# Altium schematic symbol library altera.SCHLIB: 68 symbols (part 6 of 6)
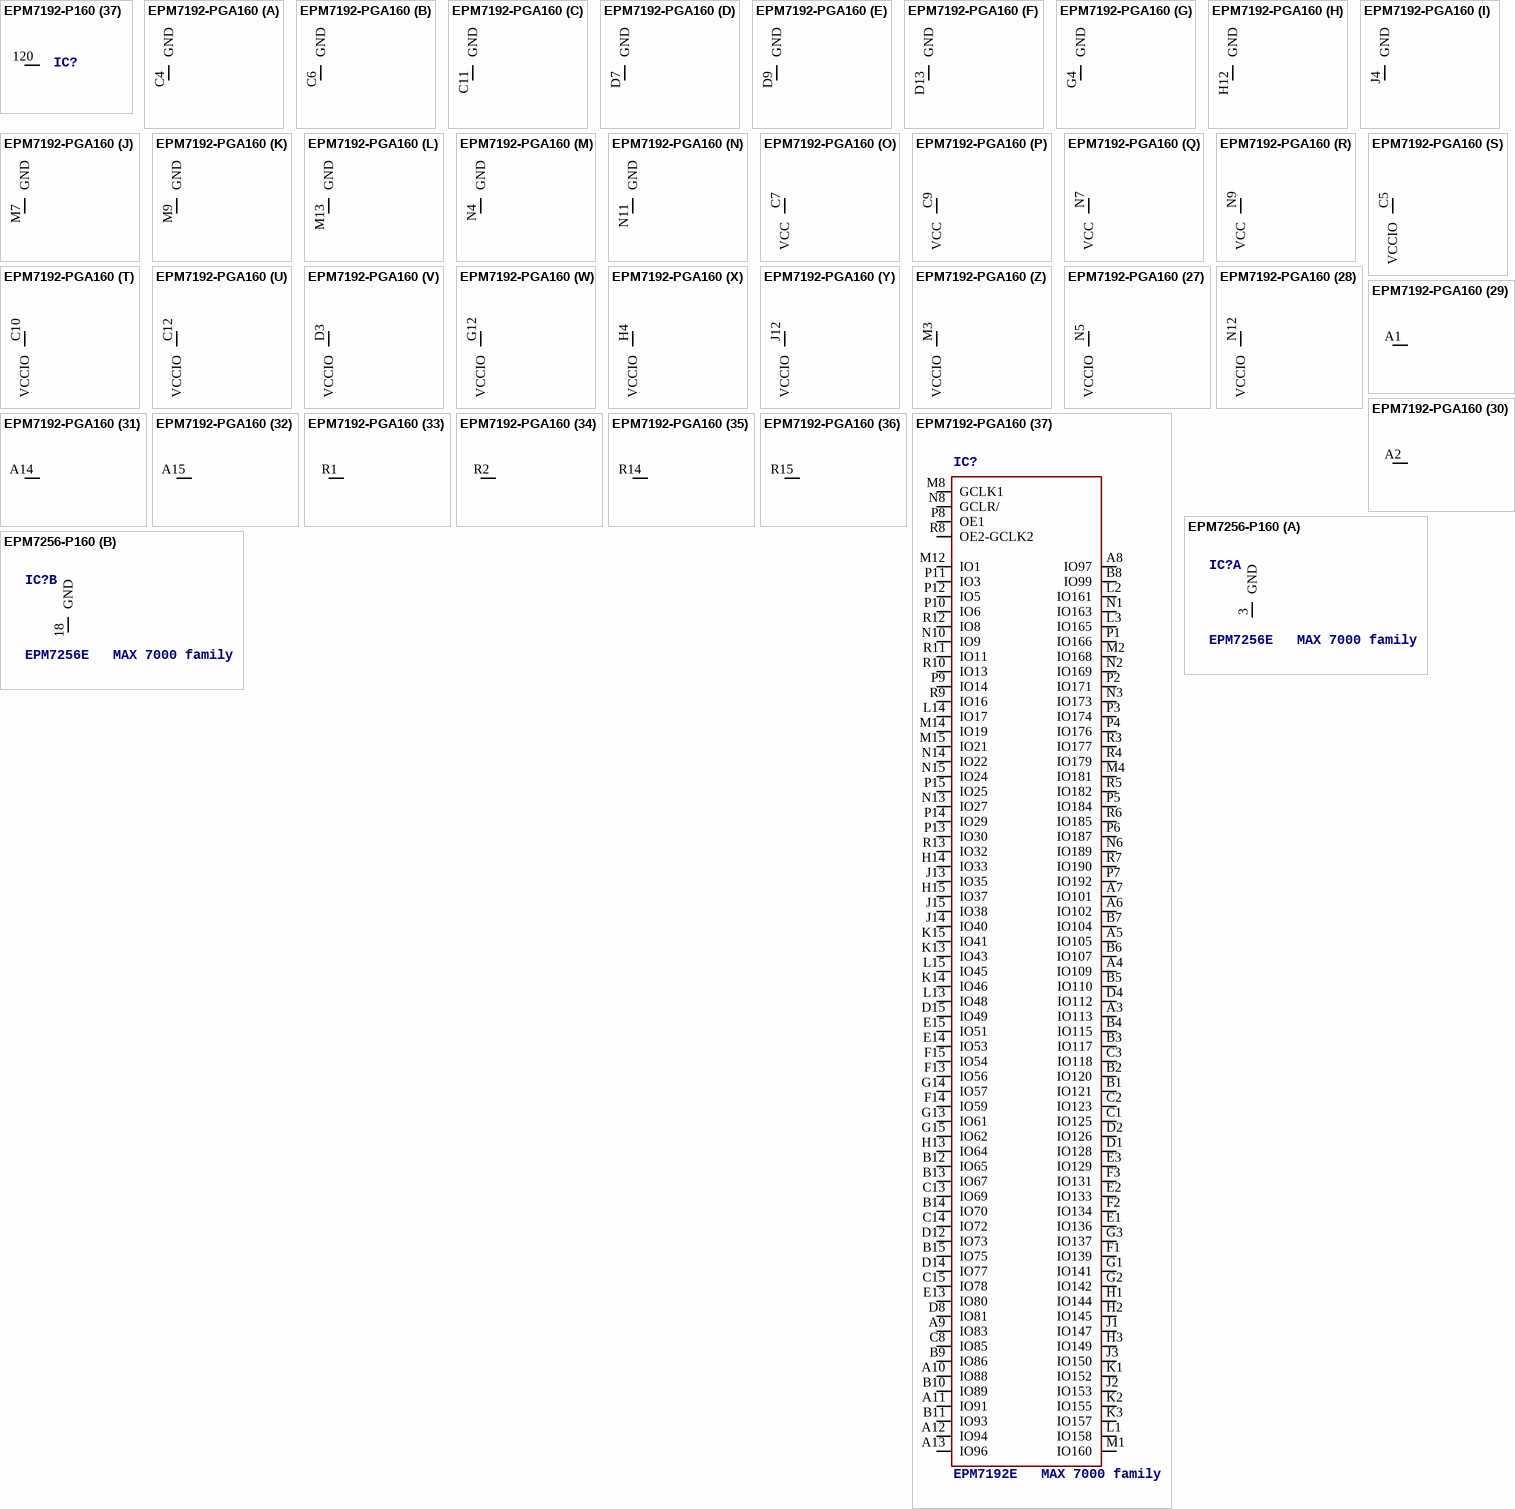
[diagram p62: symbols EPM7192-P160 to EPM7256-P160]

## EPM7192-P160
designator IC?, comment EPM7192E   MAX 7000 family
MPN: EPM7192SQC160-10N; OC_FARNELL: 1549438; OC_NEWARK: 51R9820
footprint PQFP160
part A pins: 3 GND (power)
part B pins: 18 GND (power)
part C pins: 32 GND (power)
part D pins: 47 GND (power)
part E pins: 57 GND (power)
part F pins: 64 GND (power)
part G pins: 66 GND (power)
part H pins: 81 GND (power)
part I pins: 96 GND (power)
part J pins: 111 GND (power)
part K pins: 126 GND (power)
part L pins: 138 GND (power)
part M pins: 143 GND (power)
part N pins: 148 GND (power)
part O pins: 56 VCC (power)
part P pins: 65 VCC (power)
part Q pins: 137 VCC (power)
part R pins: 144 VCC (power)
part S pins: 10 VCCIO (power)
part T pins: 25 VCCIO (power)
part U pins: 40 VCCIO (power)
part V pins: 55 VCCIO (power)
part W pins: 74 VCCIO (power)
part X pins: 89 VCCIO (power)
part Y pins: 103 VCCIO (power)
part Z pins: 118 VCCIO (power)
part 27 pins: 133 VCCIO (power)
part 28 pins: 155 VCCIO (power)
part 29 pins: 2 IO25, 4 IO24, 5 IO22, 6 IO21, 7 IO19, 8 IO17, 9 IO48, 12 IO46, 13 IO45, 14 IO43, 15 IO41, 16 IO40, 17 IO38, 19 IO37, 20 IO35, 21 IO33, 22 IO64, 23 IO62, 24 IO61, 26 IO59, 27 IO57, 28 IO56, 29 IO54, 30 IO53, 31 IO51, 33 IO49, 34 IO80, 35 IO78, 36 IO77, 37 IO75, 38 IO73, 41 IO72, 42 IO70, 43 IO69, 44 IO67, 45 IO65, 46 IO96, 48 IO94, 49 IO93, 50 IO91, 51 IO89, 52 IO88, 53 IO86, 58 IO85, 59 IO83, 60 IO81, 61 IO97, 62 IO99, 63 IO101, 68 IO102, 69 IO104, 70 IO105, 71 IO107, 72 IO109, 73 IO110, 75 IO112, 76 IO113, 77 IO115, 78 IO117, 79 IO118, 80 IO120, 83 IO121, 84 IO123, 85 IO125, 86 IO126, 87 IO128, 88 IO129, 90 IO131, 91 IO133, 92 IO134, 93 IO136, 94 IO137, 95 IO139, 97 IO141, 98 IO142, 99 IO144, 100 IO145, 101 IO147, 102 IO149, 104 IO150, 105 IO152, 106 IO153, 107 IO155, 108 IO157, 109 IO158, 112 IO160, 113 IO161, 114 IO163, 115 IO165, 116 IO166, 117 IO168, 119 IO169, 121 IO171, 122 IO173, 123 IO174, 124 IO176, 125 IO177, 127 IO179, 128 IO181, 129 IO182, 130 IO184, 131 IO185, 132 IO187, 134 IO189, 135 IO190, 136 IO192, 139 GCLK1, 140 OE1, 141 GCLR/, 142 OE2-GCLK2, 145 IO16, 146 IO14, 147 IO13, 149 IO11, 150 IO9, 151 IO8, 152 IO6, 153 IO5, 154 IO3, 156 IO1, 157 IO32, 158 IO30, 159 IO29, 160 IO27
part 30 pins: 1 NC
part 31 pins: 11 NC
part 32 pins: 39 NC
part 33 pins: 54 NC
part 34 pins: 67 NC
part 35 pins: 82 NC
part 36 pins: 110 NC
part 37 pins: 120 NC

## EPM7192-PGA160
designator IC?, comment EPM7192E   MAX 7000 family
OC_FARNELL: unknown; OC_NEWARK: unknown
footprint PGA160
part A pins: C4 GND (power)
part B pins: C6 GND (power)
part C pins: C11 GND (power)
part D pins: D7 GND (power)
part E pins: D9 GND (power)
part F pins: D13 GND (power)
part G pins: G4 GND (power)
part H pins: H12 GND (power)
part I pins: J4 GND (power)
part J pins: M7 GND (power)
part K pins: M9 GND (power)
part L pins: M13 GND (power)
part M pins: N4 GND (power)
part N pins: N11 GND (power)
part O pins: C7 VCC (power)
part P pins: C9 VCC (power)
part Q pins: N7 VCC (power)
part R pins: N9 VCC (power)
part S pins: C5 VCCIO (power)
part T pins: C10 VCCIO (power)
part U pins: C12 VCCIO (power)
part V pins: D3 VCCIO (power)
part W pins: G12 VCCIO (power)
part X pins: H4 VCCIO (power)
part Y pins: J12 VCCIO (power)
part Z pins: M3 VCCIO (power)
part 27 pins: N5 VCCIO (power)
part 28 pins: N12 VCCIO (power)
part 29 pins: A1 NC
part 30 pins: A2 NC
part 31 pins: A14 NC
part 32 pins: A15 NC
part 33 pins: R1 NC
part 34 pins: R2 NC
part 35 pins: R14 NC
part 36 pins: R15 NC
part 37 pins: A3 IO113, A4 IO109, A5 IO105, A6 IO102, A7 IO101, A8 IO97, A9 IO83, A10 IO88, A11 IO91, A12 IO94, A13 IO96, B1 IO121, B2 IO120, B3 IO117, B4 IO115, B5 IO110, B6 IO107, B7 IO104, B8 IO99, B9 IO86, B10 IO89, B11 IO93, B12 IO65, B13 IO67, B14 IO70, B15 IO75, C1 IO125, C2 IO123, C3 IO118, C8 IO85, C13 IO69, C14 IO72, C15 IO78, D1 IO128, D2 IO126, D4 IO112, D8 IO81, D12 IO73, D14 IO77, D15 IO49, E1 IO136, E2 IO133, E3 IO129, E13 IO80, E14 IO53, E15 IO51, F1 IO139, F2 IO134, F3 IO131, F13 IO56, F14 IO59, F15 IO54, G1 IO141, G2 IO142, G3 IO137, G13 IO61, G14 IO57, G15 IO62, H1 IO144, H2 IO145, H3 IO149, H13 IO64, H14 IO33, H15 IO37, J1 IO147, J2 IO153, J3 IO150, J13 IO35, J14 IO40, J15 IO38, K1 IO152, K2 IO155, K3 IO157, K13 IO43, K14 IO46, K15 IO41, L1 IO158, L2 IO161, L3 IO165, L13 IO48, L14 IO17, L15 IO45, M1 IO160, M2 IO168, M4 IO181, M8 GCLK1, M12 IO1, M14 IO19, M15 IO21, N1 IO163, N2 IO169, N3 IO173, N6 IO189, N8 GCLR/, N10 IO9, N13 IO27, N14 IO22, N15 IO24, P1 IO166, P2 IO171, P3 IO174, P4 IO176, P5 IO184, P6 IO187, P7 IO192, P8 OE1, P9 IO14, P10 IO6, P11 IO3, P12 IO5, P13 IO30, P14 IO29, P15 IO25, R3 IO177, R4 IO179, R5 IO182, R6 IO185, R7 IO190, R8 OE2-GCLK2, R9 IO16, R10 IO13, R11 IO11, R12 IO8, R13 IO32

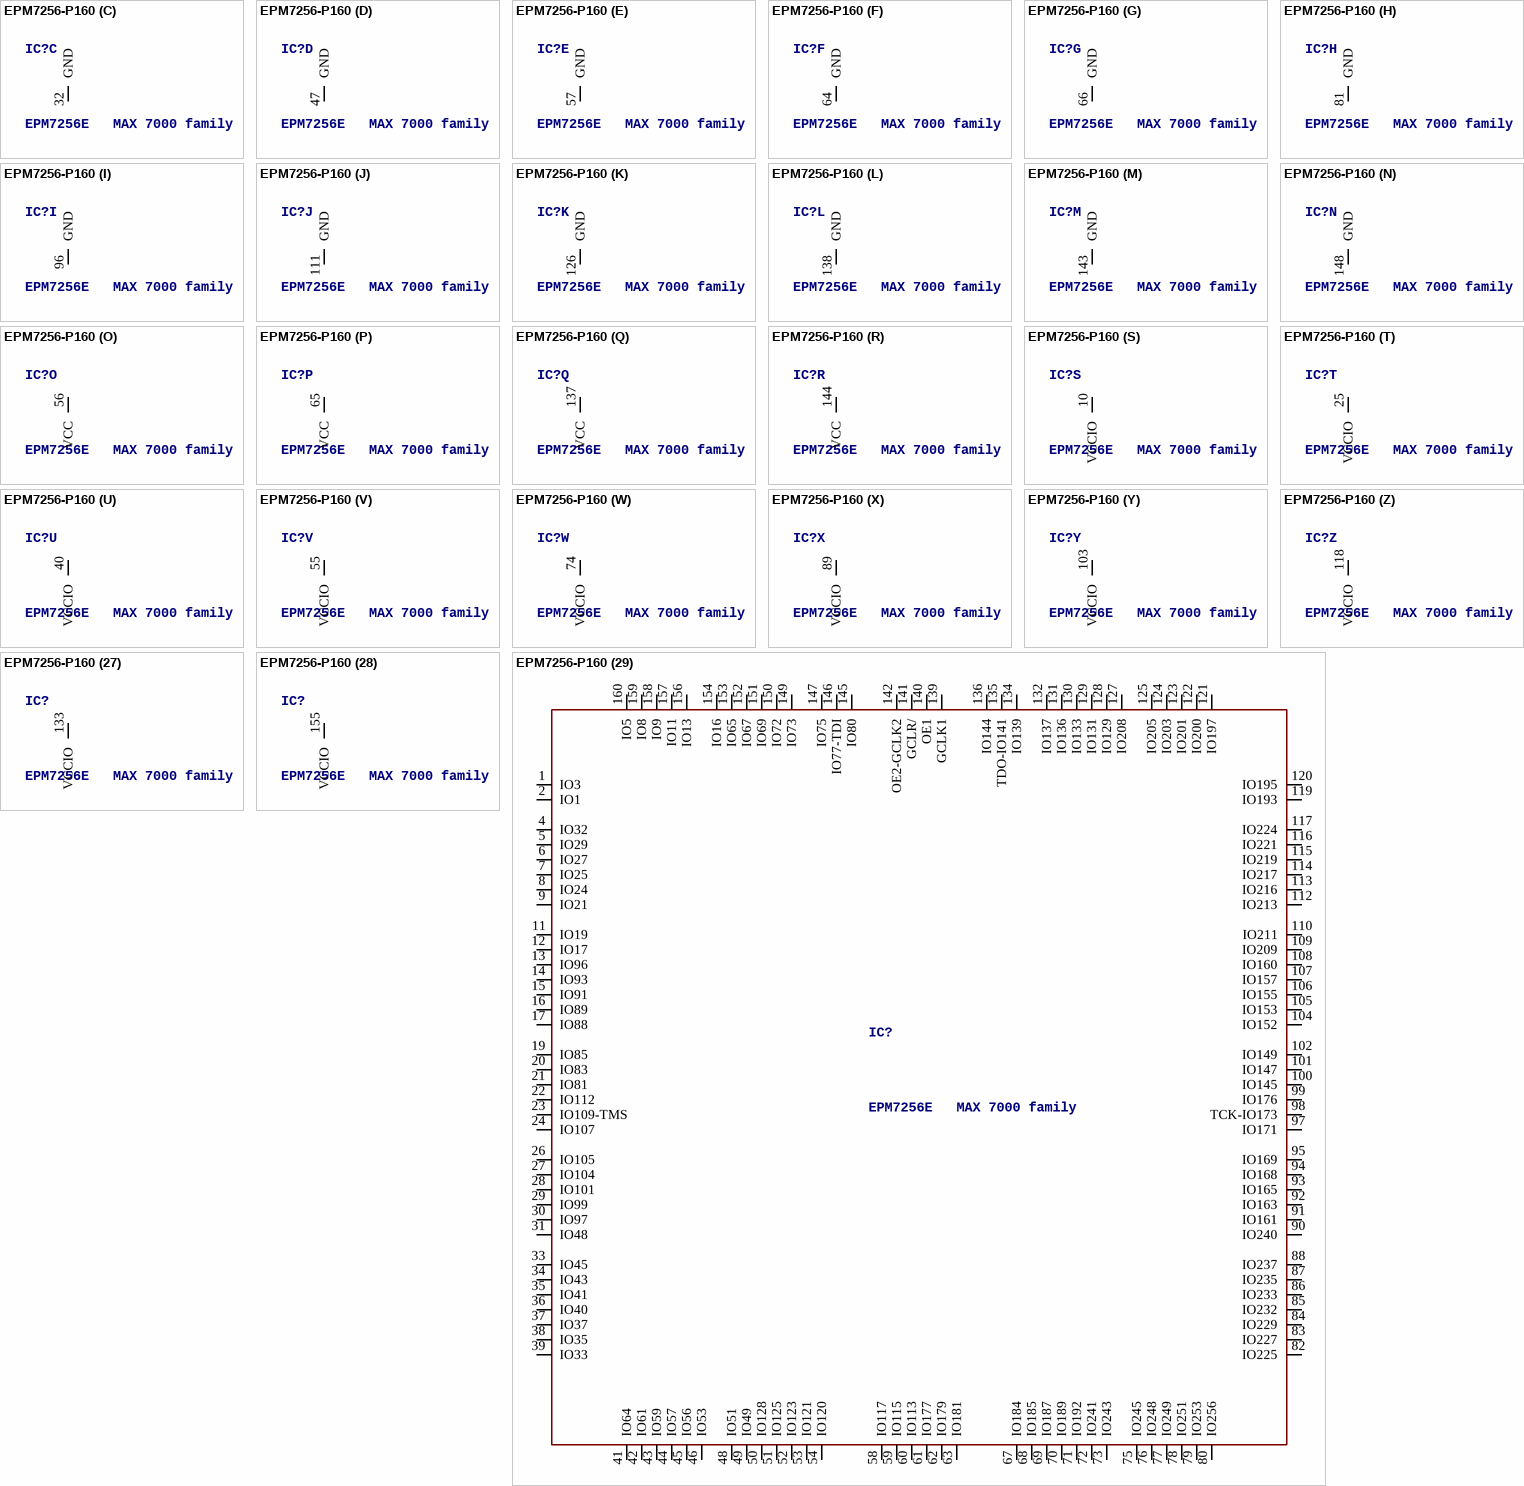
[diagram p48: symbol EPM7256-P160]

## EPM7256-P160
designator IC?, comment EPM7256E   MAX 7000 family
MPN: EPM7256EQC160-12; OC_FARNELL: unknown; OC_NEWARK: 51R9894
footprint PQFP160
part A pins: 3 GND (power)
part B pins: 18 GND (power)
part C pins: 32 GND (power)
part D pins: 47 GND (power)
part E pins: 57 GND (power)
part F pins: 64 GND (power)
part G pins: 66 GND (power)
part H pins: 81 GND (power)
part I pins: 96 GND (power)
part J pins: 111 GND (power)
part K pins: 126 GND (power)
part L pins: 138 GND (power)
part M pins: 143 GND (power)
part N pins: 148 GND (power)
part O pins: 56 VCC (power)
part P pins: 65 VCC (power)
part Q pins: 137 VCC (power)
part R pins: 144 VCC (power)
part S pins: 10 VCCIO (power)
part T pins: 25 VCCIO (power)
part U pins: 40 VCCIO (power)
part V pins: 55 VCCIO (power)
part W pins: 74 VCCIO (power)
part X pins: 89 VCCIO (power)
part Y pins: 103 VCCIO (power)
part Z pins: 118 VCCIO (power)
part 27 pins: 133 VCCIO (power)
part 28 pins: 155 VCCIO (power)
part 29 pins: 1 IO3, 2 IO1, 4 IO32, 5 IO29, 6 IO27, 7 IO25, 8 IO24, 9 IO21, 11 IO19, 12 IO17, 13 IO96, 14 IO93, 15 IO91, 16 IO89, 17 IO88, 19 IO85, 20 IO83, 21 IO81, 22 IO112, 23 IO109-TMS, 24 IO107, 26 IO105, 27 IO104, 28 IO101, 29 IO99, 30 IO97, 31 IO48, 33 IO45, 34 IO43, 35 IO41, 36 IO40, 37 IO37, 38 IO35, 39 IO33, 41 IO64, 42 IO61, 43 IO59, 44 IO57, 45 IO56, 46 IO53, 48 IO51, 49 IO49, 50 IO128, 51 IO125, 52 IO123, 53 IO121, 54 IO120, 58 IO117, 59 IO115, 60 IO113, 61 IO177, 62 IO179, 63 IO181, 67 IO184, 68 IO185, 69 IO187, 70 IO189, 71 IO192, 72 IO241, 73 IO243, 75 IO245, 76 IO248, 77 IO249, 78 IO251, 79 IO253, 80 IO256, 82 IO225, 83 IO227, 84 IO229, 85 IO232, 86 IO233, 87 IO235, 88 IO237, 90 IO240, 91 IO161, 92 IO163, 93 IO165, 94 IO168, 95 IO169, 97 IO171, 98 TCK-IO173, 99 IO176, 100 IO145, 101 IO147, 102 IO149, 104 IO152, 105 IO153, 106 IO155, 107 IO157, 108 IO160, 109 IO209, 110 IO211, 112 IO213, 113 IO216, 114 IO217, 115 IO219, 116 IO221, 117 IO224, 119 IO193, 120 IO195, 121 IO197, 122 IO200, 123 IO201, 124 IO203, 125 IO205, 127 IO208, 128 IO129, 129 IO131, 130 IO133, 131 IO136, 132 IO137, 134 IO139, 135 TDO-IO141, 136 IO144, 139 GCLK1, 140 OE1, 141 GCLR/, 142 OE2-GCLK2, 145 IO80, 146 IO77-TDI, 147 IO75, 149 IO73, 150 IO72, 151 IO69, 152 IO67, 153 IO65, 154 IO16, 156 IO13, 157 IO11, 158 IO9, 159 IO8, 160 IO5

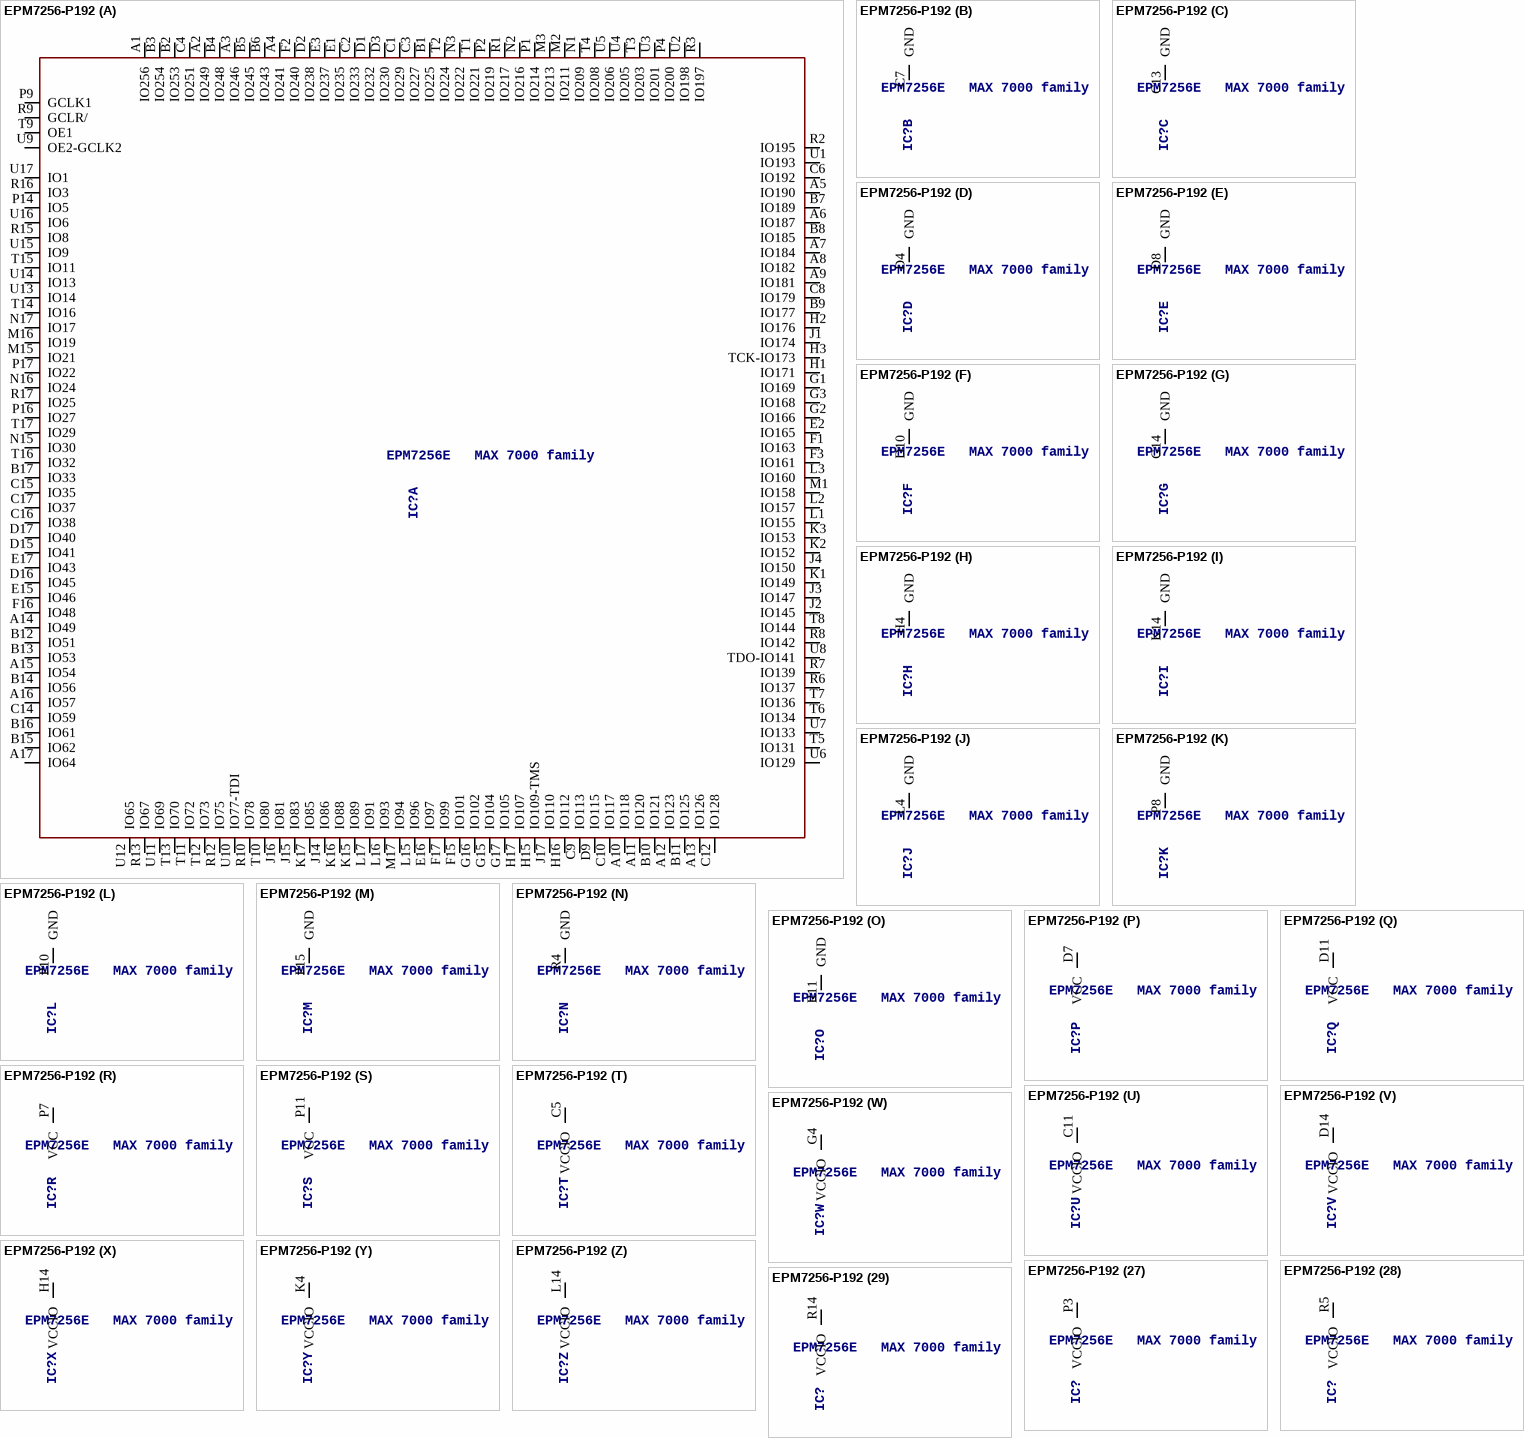
[diagram p49: symbol EPM7256-P192]

## EPM7256-P192
designator IC?, comment EPM7256E   MAX 7000 family
OC_FARNELL: unknown; OC_NEWARK: unknown
footprint PGA192
part A pins: A1 IO256, A2 IO249, A3 IO246, A4 IO241, A5 IO190, A6 IO187, A7 IO184, A8 IO182, A9 IO181, A10 IO118, A11 IO120, A12 IO123, A13 IO126, A14 IO49, A15 IO54, A16 IO57, A17 IO64, B1 IO225, B2 IO253, B3 IO254, B4 IO248, B5 IO245, B6 IO243, B7 IO189, B8 IO185, B9 IO177, B10 IO121, B11 IO125, B12 IO51, B13 IO53, B14 IO56, B15 IO62, B16 IO61, B17 IO33, C1 IO229, C2 IO233, C3 IO227, C4 IO251, C6 IO192, C8 IO179, C9 IO113, C10 IO117, C12 IO128, C14 IO59, C15 IO35, C16 IO38, C17 IO37, D1 IO232, D2 IO238, D3 IO230, D9 IO115, D15 IO41, D16 IO45, D17 IO40, E1 IO235, E2 IO165, E3 IO237, E15 IO46, E16 IO97, E17 IO43, F1 IO163, F2 IO240, F3 IO161, F15 IO101, F16 IO48, F17 IO99, G1 IO169, G2 IO166, G3 IO168, G15 IO104, G16 IO102, G17 IO105, H1 IO171, H2 IO176, H3 TCK-IO173, H15 IO109-TMS, H16 IO112, H17 IO107, J1 IO174, J2 IO145, J3 IO147, J4 IO150, J14 IO86, J15 IO83, J16 IO81, J17 IO110, K1 IO149, K2 IO152, K3 IO153, K15 IO89, K16 IO88, K17 IO85, L1 IO155, L2 IO157, L3 IO160, L15 IO96, L16 IO93, L17 IO91, M1 IO158, M2 IO211, M3 IO213, M15 IO21, M16 IO19, M17 IO94, N1 IO209, N2 IO216, N3 IO222, N15 IO30, N16 IO24, N17 IO17, P1 IO214, P2 IO219, P4 IO200, P9 GCLK1, P14 IO5, P16 IO27, P17 IO22, R1 IO217, R2 IO195, R3 IO197, R6 IO137, R7 IO139, R8 IO142, R9 GCLR/, R10 IO78, R12 IO75, R13 IO67, R15 IO8, R16 IO3, R17 IO25, T1 IO221, T2 IO224, T3 IO203, T4 IO208, T5 IO131, T6 IO134, T7 IO136, T8 IO144, T9 OE1, T10 IO80, T11 IO72, T12 IO73, T13 IO70, T14 IO16, T15 IO11, T16 IO32, T17 IO29, U1 IO193, U2 IO198, U3 IO201, U4 IO205, U5 IO206, U6 IO129, U7 IO133, U8 TDO-IO141, U9 OE2-GCLK2, U10 IO77-TDI, U11 IO69, U12 IO65, U13 IO14, U14 IO13, U15 IO9, U16 IO6, U17 IO1
part B pins: C7 GND (power)
part C pins: C13 GND (power)
part D pins: D4 GND (power)
part E pins: D8 GND (power)
part F pins: D10 GND (power)
part G pins: G14 GND (power)
part H pins: H4 GND (power)
part I pins: K14 GND (power)
part J pins: L4 GND (power)
part K pins: P8 GND (power)
part L pins: P10 GND (power)
part M pins: P15 GND (power)
part N pins: R4 GND (power)
part O pins: R11 GND (power)
part P pins: D7 VCC (power)
part Q pins: D11 VCC (power)
part R pins: P7 VCC (power)
part S pins: P11 VCC (power)
part T pins: C5 VCCIO (power)
part U pins: C11 VCCIO (power)
part V pins: D14 VCCIO (power)
part W pins: G4 VCCIO (power)
part X pins: H14 VCCIO (power)
part Y pins: K4 VCCIO (power)
part Z pins: L14 VCCIO (power)
part 27 pins: P3 VCCIO (power)
part 28 pins: R5 VCCIO (power)
part 29 pins: R14 VCCIO (power)

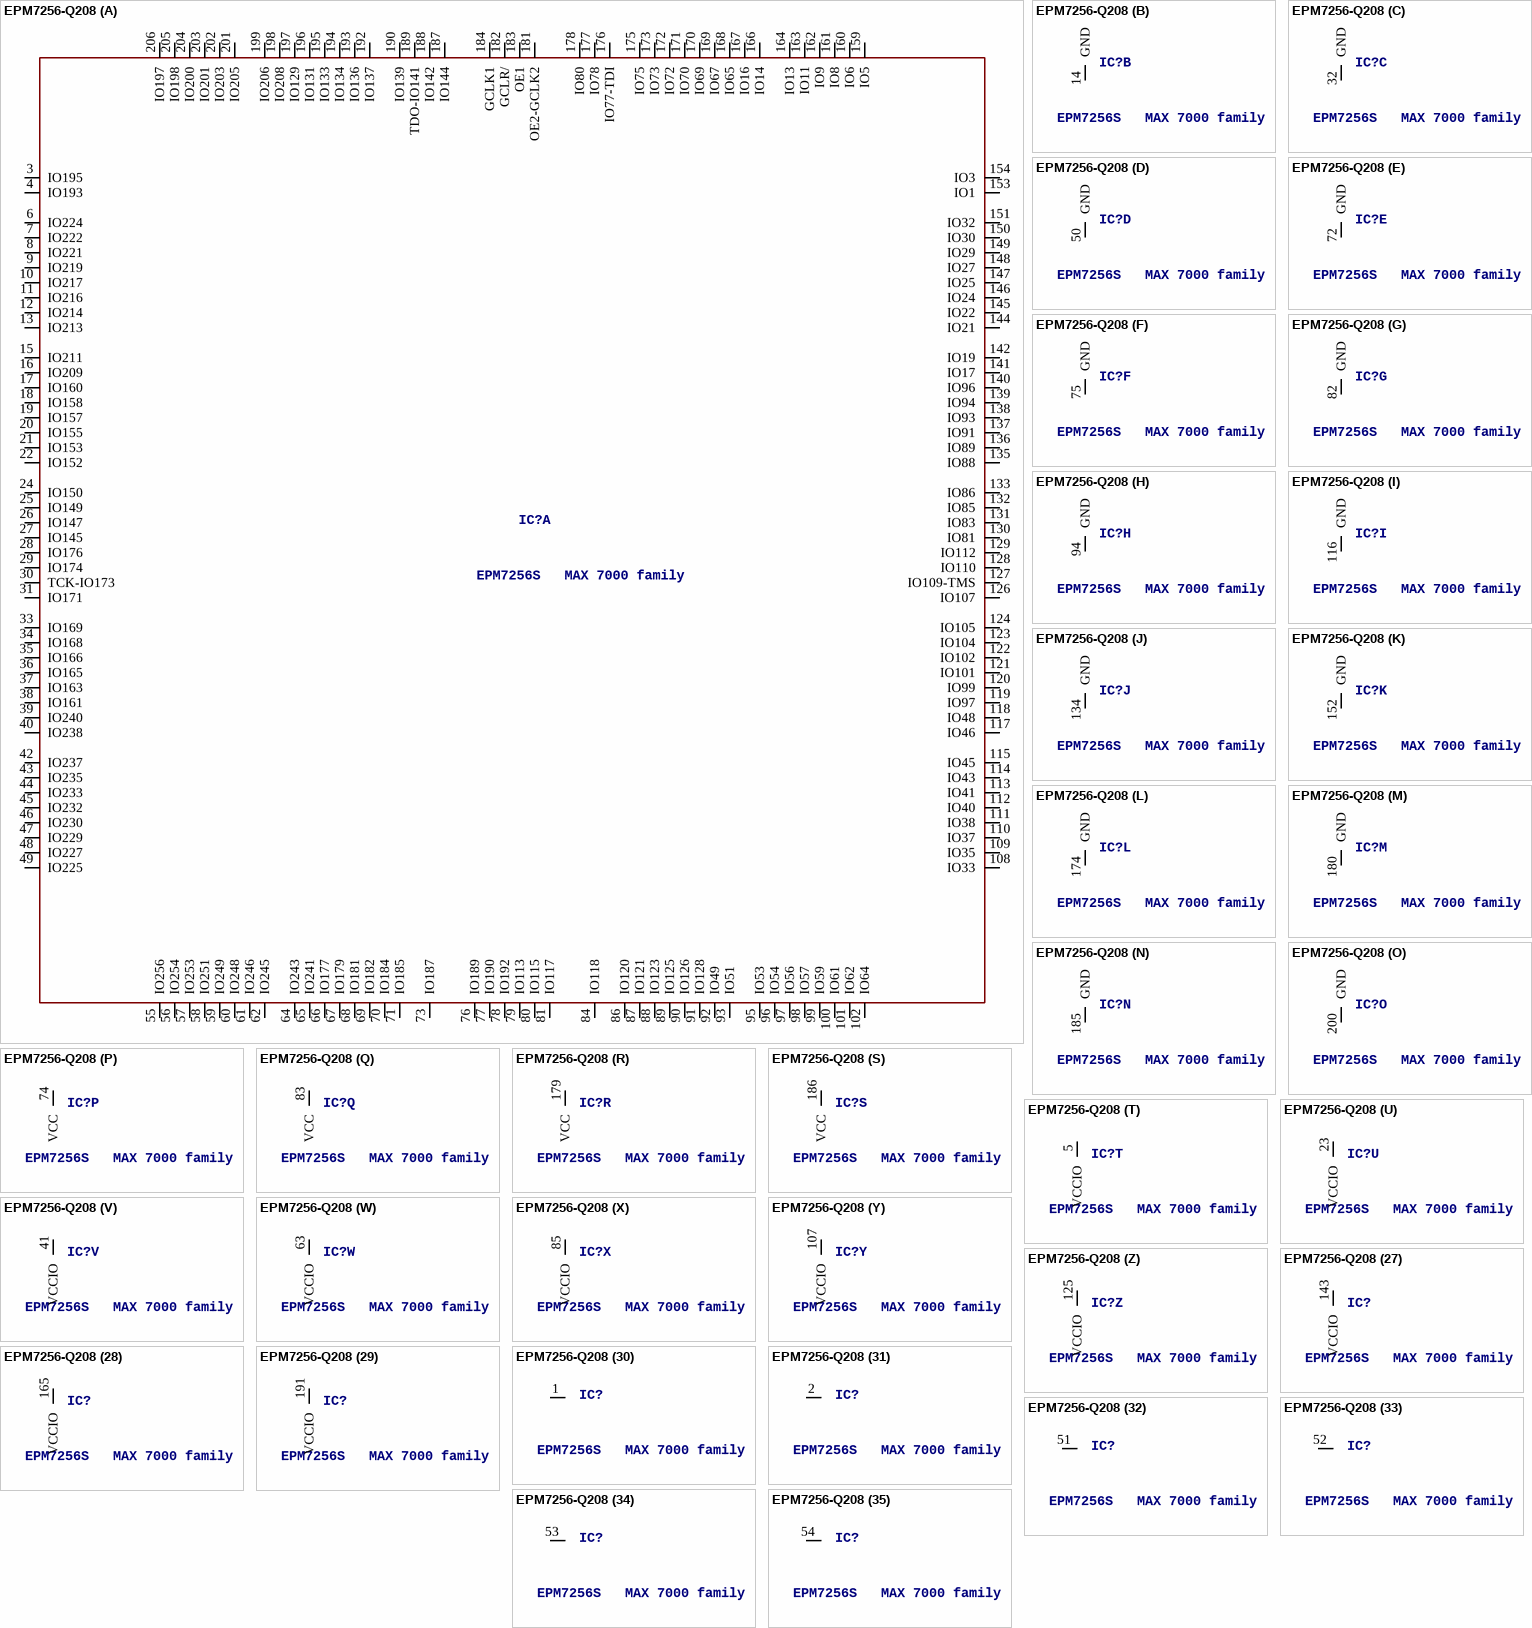
[diagram p50: symbol EPM7256-Q208]

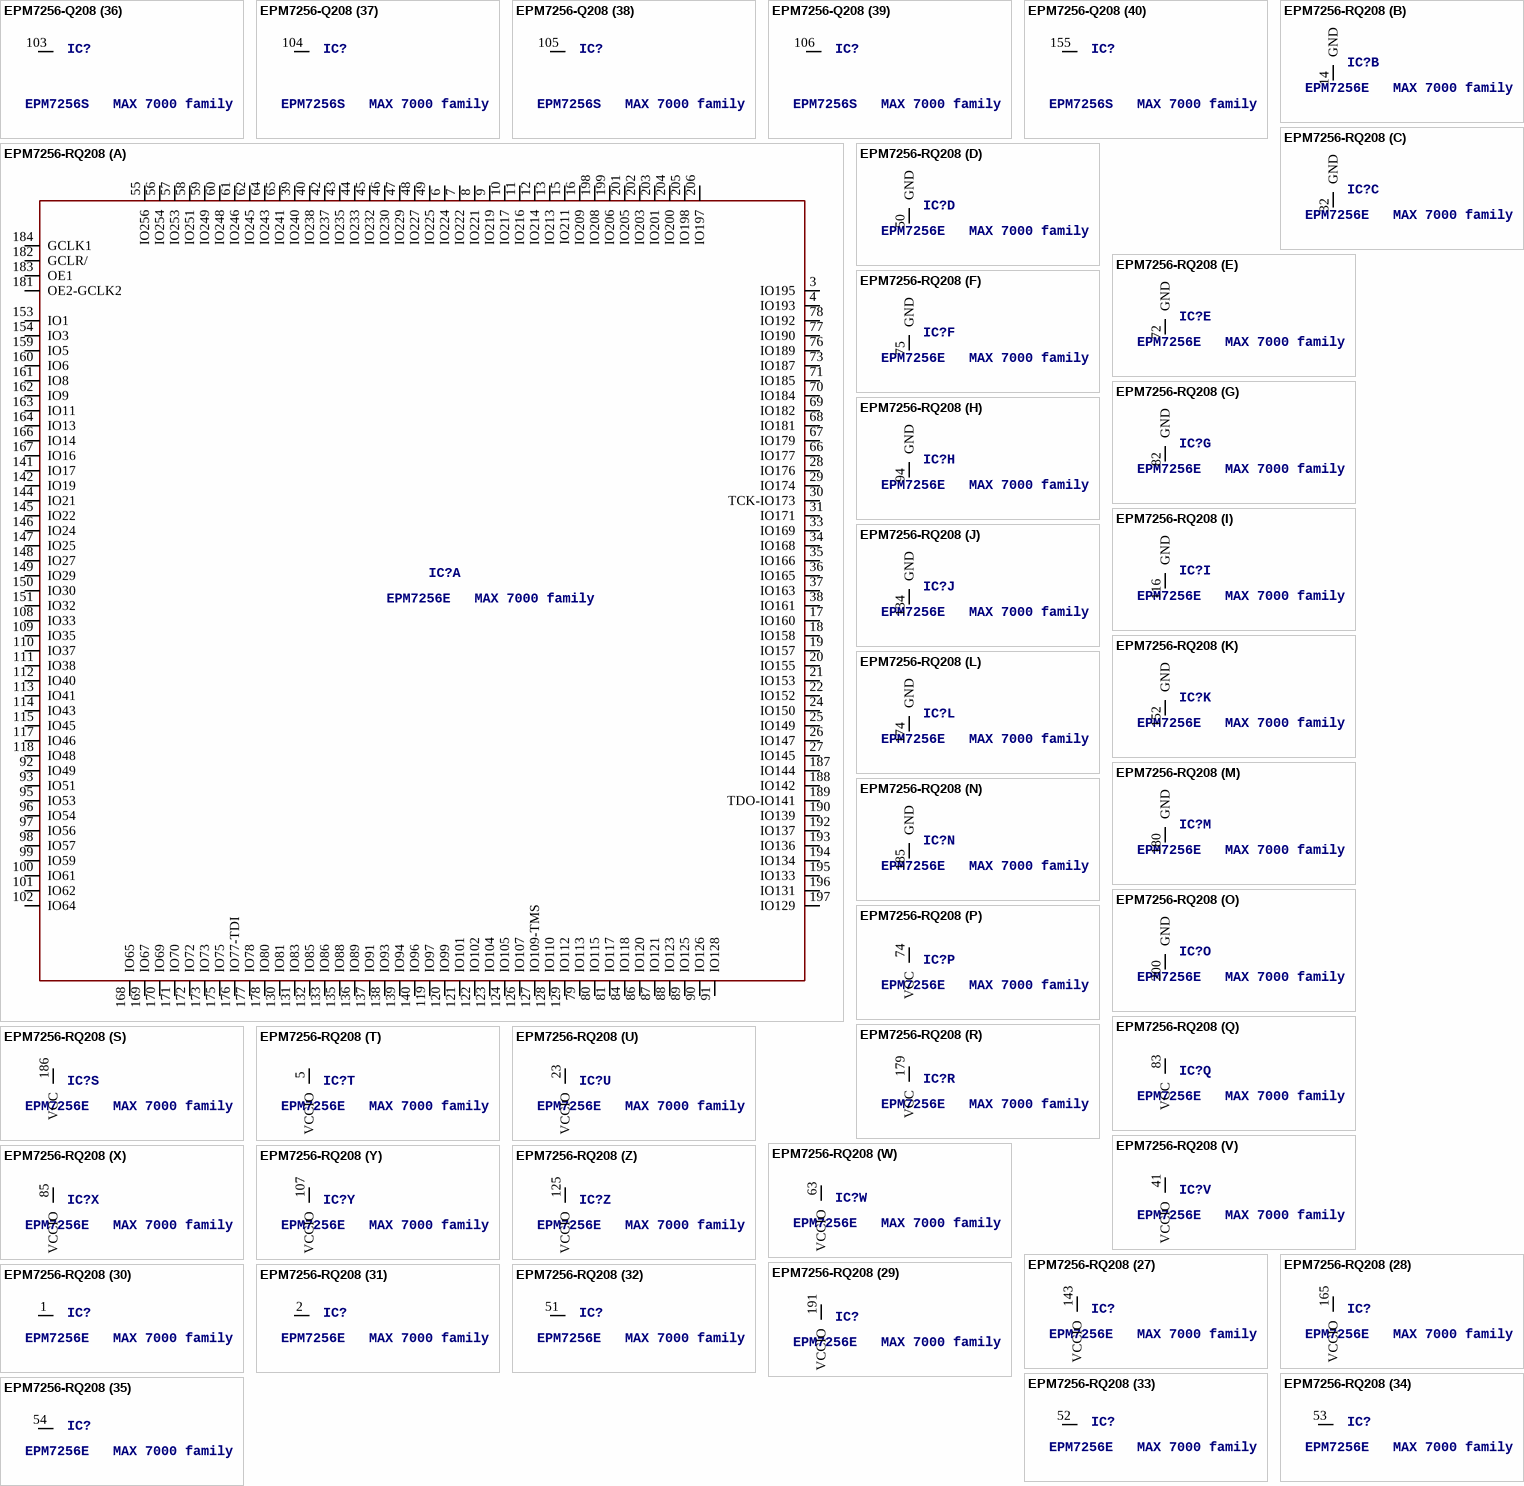
[diagram p51: symbols EPM7256-Q208 to EPM7256-RQ208]

## EPM7256-Q208
designator IC?, comment EPM7256S   MAX 7000 family
MPN: EPM7256AEQC208-10N; OC_FARNELL: 1549440; OC_NEWARK: 51R9842
footprint RQFP208
part A pins: 3 IO195, 4 IO193, 6 IO224, 7 IO222, 8 IO221, 9 IO219, 10 IO217, 11 IO216, 12 IO214, 13 IO213, 15 IO211, 16 IO209, 17 IO160, 18 IO158, 19 IO157, 20 IO155, 21 IO153, 22 IO152, 24 IO150, 25 IO149, 26 IO147, 27 IO145, 28 IO176, 29 IO174, 30 TCK-IO173, 31 IO171, 33 IO169, 34 IO168, 35 IO166, 36 IO165, 37 IO163, 38 IO161, 39 IO240, 40 IO238, 42 IO237, 43 IO235, 44 IO233, 45 IO232, 46 IO230, 47 IO229, 48 IO227, 49 IO225, 55 IO256, 56 IO254, 57 IO253, 58 IO251, 59 IO249, 60 IO248, 61 IO246, 62 IO245, 64 IO243, 65 IO241, 66 IO177, 67 IO179, 68 IO181, 69 IO182, 70 IO184, 71 IO185, 73 IO187, 76 IO189, 77 IO190, 78 IO192, 79 IO113, 80 IO115, 81 IO117, 84 IO118, 86 IO120, 87 IO121, 88 IO123, 89 IO125, 90 IO126, 91 IO128, 92 IO49, 93 IO51, 95 IO53, 96 IO54, 97 IO56, 98 IO57, 99 IO59, 100 IO61, 101 IO62, 102 IO64, 108 IO33, 109 IO35, 110 IO37, 111 IO38, 112 IO40, 113 IO41, 114 IO43, 115 IO45, 117 IO46, 118 IO48, 119 IO97, 120 IO99, 121 IO101, 122 IO102, 123 IO104, 124 IO105, 126 IO107, 127 IO109-TMS, 128 IO110, 129 IO112, 130 IO81, 131 IO83, 132 IO85, 133 IO86, 135 IO88, 136 IO89, 137 IO91, 138 IO93, 139 IO94, 140 IO96, 141 IO17, 142 IO19, 144 IO21, 145 IO22, 146 IO24, 147 IO25, 148 IO27, 149 IO29, 150 IO30, 151 IO32, 153 IO1, 154 IO3, 159 IO5, 160 IO6, 161 IO8, 162 IO9, 163 IO11, 164 IO13, 166 IO14, 167 IO16, 168 IO65, 169 IO67, 170 IO69, 171 IO70, 172 IO72, 173 IO73, 175 IO75, 176 IO77-TDI, 177 IO78, 178 IO80, 181 OE2-GCLK2, 182 GCLR/, 183 OE1, 184 GCLK1, 187 IO144, 188 IO142, 189 TDO-IO141, 190 IO139, 192 IO137, 193 IO136, 194 IO134, 195 IO133, 196 IO131, 197 IO129, 198 IO208, 199 IO206, 201 IO205, 202 IO203, 203 IO201, 204 IO200, 205 IO198, 206 IO197
part B pins: 14 GND (power)
part C pins: 32 GND (power)
part D pins: 50 GND (power)
part E pins: 72 GND (power)
part F pins: 75 GND (power)
part G pins: 82 GND (power)
part H pins: 94 GND (power)
part I pins: 116 GND (power)
part J pins: 134 GND (power)
part K pins: 152 GND (power)
part L pins: 174 GND (power)
part M pins: 180 GND (power)
part N pins: 185 GND (power)
part O pins: 200 GND (power)
part P pins: 74 VCC (power)
part Q pins: 83 VCC (power)
part R pins: 179 VCC (power)
part S pins: 186 VCC (power)
part T pins: 5 VCCIO (power)
part U pins: 23 VCCIO (power)
part V pins: 41 VCCIO (power)
part W pins: 63 VCCIO (power)
part X pins: 85 VCCIO (power)
part Y pins: 107 VCCIO (power)
part Z pins: 125 VCCIO (power)
part 27 pins: 143 VCCIO (power)
part 28 pins: 165 VCCIO (power)
part 29 pins: 191 VCCIO (power)
part 30 pins: 1 NC
part 31 pins: 2 NC
part 32 pins: 51 NC
part 33 pins: 52 NC
part 34 pins: 53 NC
part 35 pins: 54 NC
part 36 pins: 103 NC
part 37 pins: 104 NC
part 38 pins: 105 NC
part 39 pins: 106 NC
part 40 pins: 155 NC
part 41 pins: 156 NC
part 42 pins: 157 NC
part 43 pins: 158 NC
part 44 pins: 207 NC
part 45 pins: 208 NC

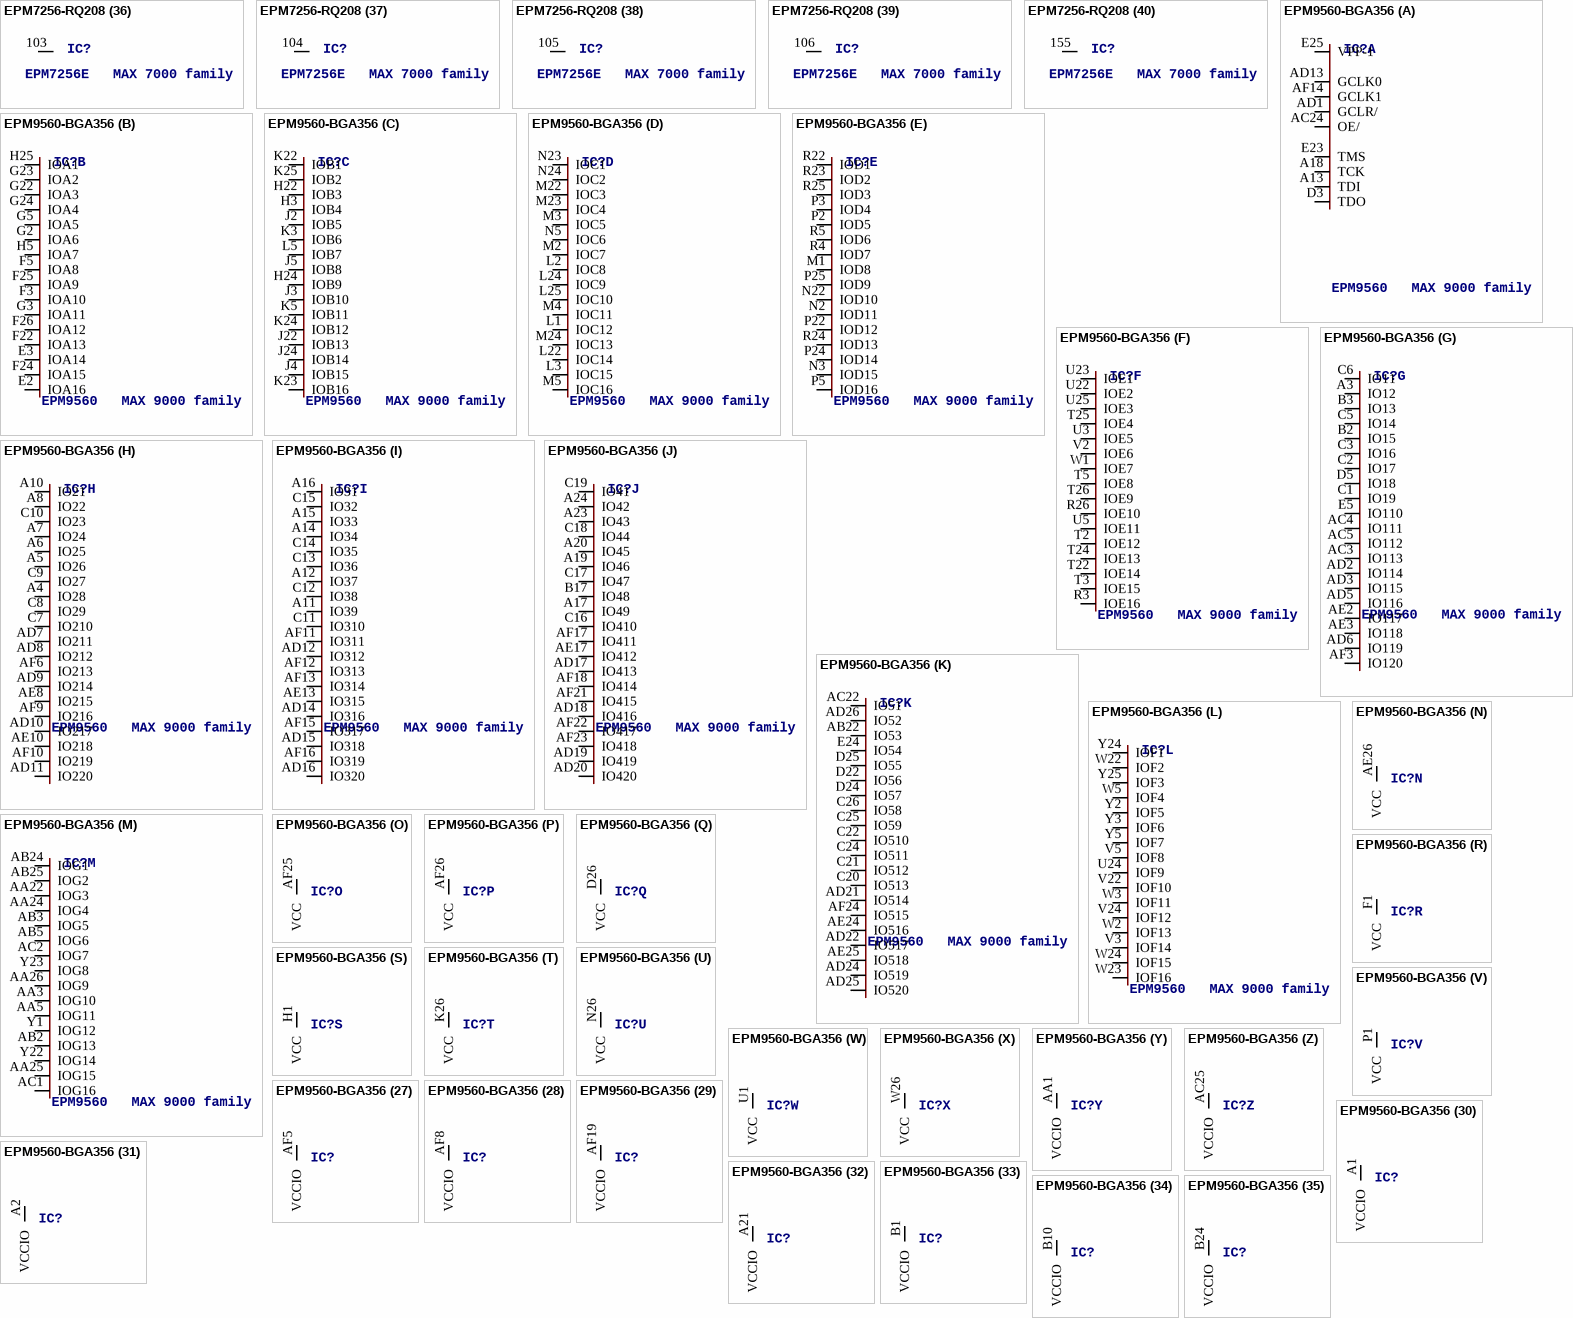
[diagram p52: symbols EPM7256-RQ208 to EPM9560-BGA356]
